# Altium footprint library Connectors.PcbLib: 79 footprints (part 5 of 5)
Each footprint in its own frame and in the unit in brackets; x right, y up, seen from the top. Pads: shape width x height; smd on the part's side, far side on the other; paste and mask are expansions set on the pad; w line width, h text height; cw(c..) or ccw(c..) is an arc to the next point about the centre after c.
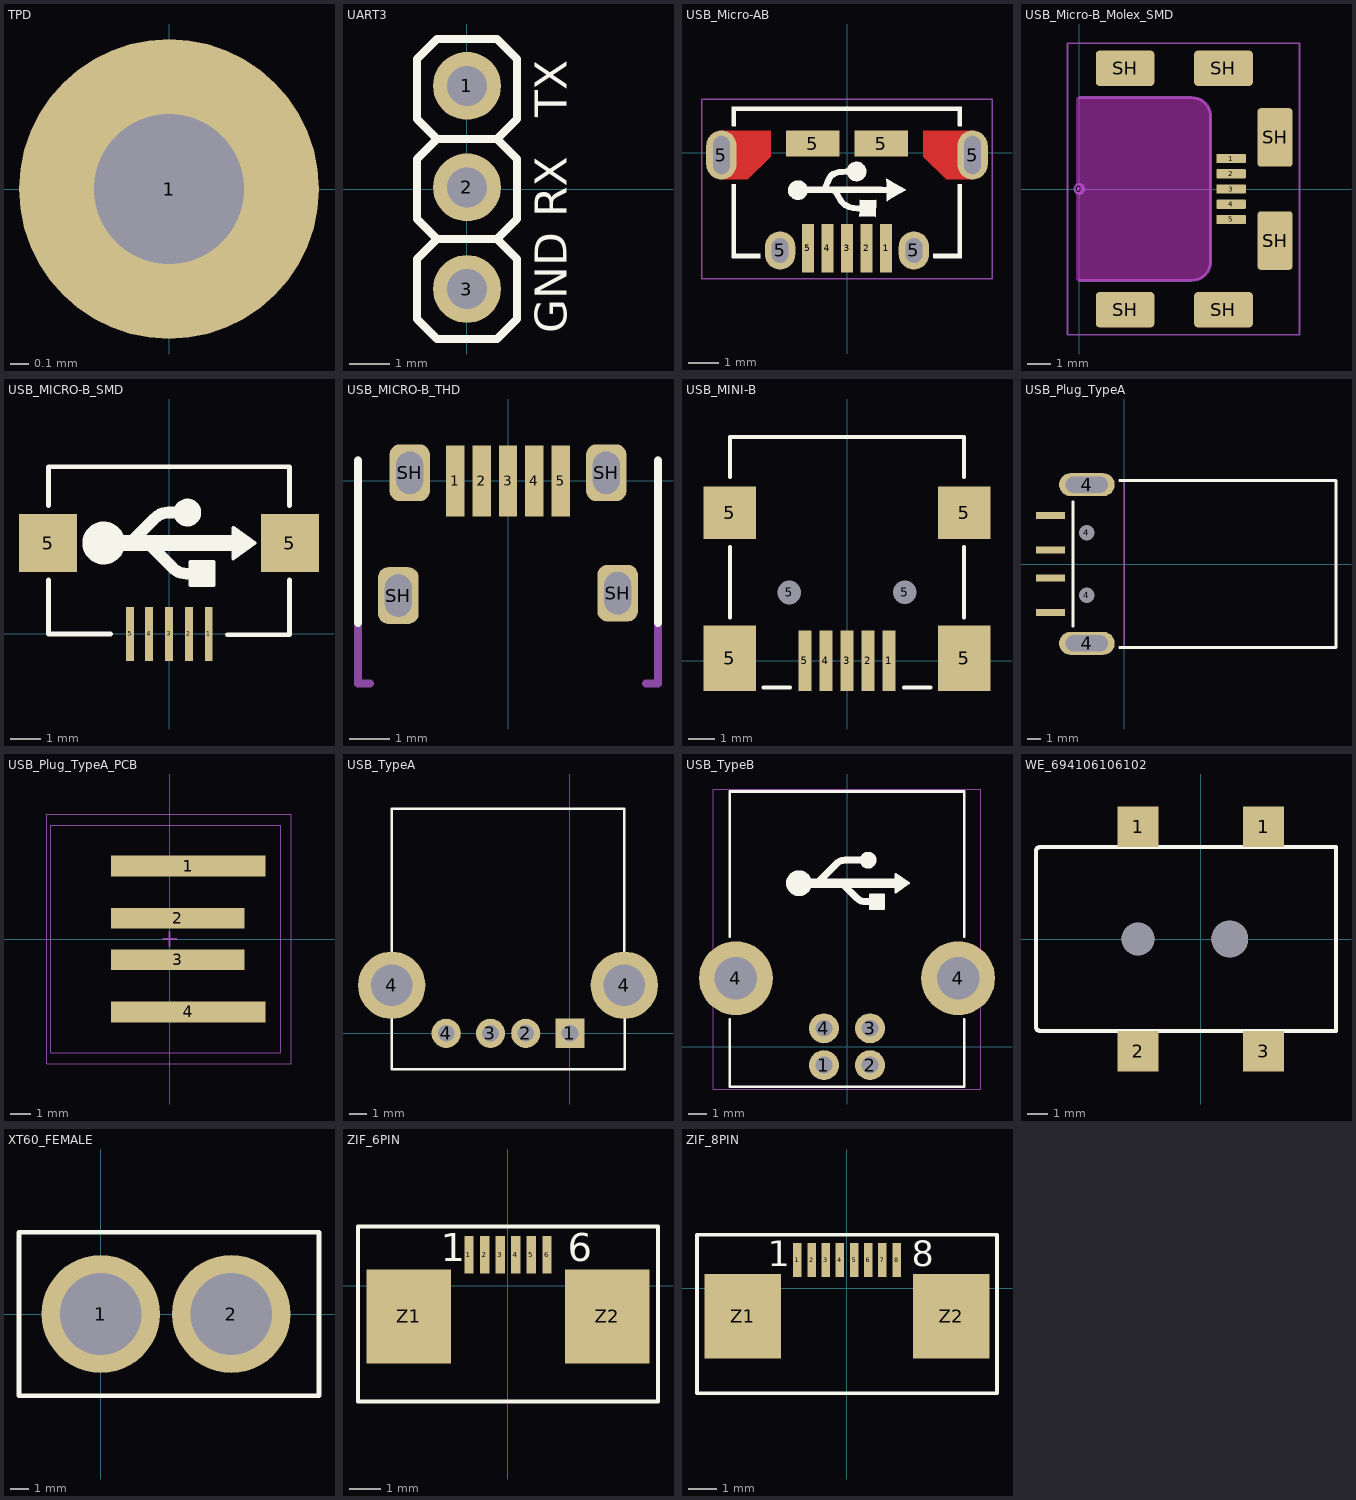
[diagram p4: the footprints below, top view; thin cyan lines are the x and y axes]

## TPD [mm] "Test point"
pads (1):
  round 1.6 hole 0.8: 1(0,0)

## UART3 [mm] "UART connector 3pin"
pads (3):
  round 1.7 hole 1 paste+0: 1(0,2.58) 2(0,0.04) 3(0,-2.5)
Top Overlay:
  lines w0.2: -0.75,-1.25 0.75,-1.25 ; -0.75,-1.25 -1.25,-1.75 -1.25,-3.25 -0.75,-3.75 0.75,-3.75 1.25,-3.25 1.25,-1.75 0.75,-1.25 ; -0.75,-1.25 -1.25,-0.75 -1.25,0.75 -0.75,1.25 ; -0.75,1.25 0.75,1.25 ; -0.75,1.25 -1.25,1.75 -1.25,3.25 -0.75,3.75 0.75,3.75 1.25,3.25 1.25,1.75 0.75,1.25 ; 0.75,-1.25 1.25,-0.75 1.25,0.75 0.75,1.25
  text "GND" at 2.5,-3.6 h0.8
  text "RX" at 2.5,-0.7 h0.8
  text "TX" at 2.5,1.8 h0.8
3D body "User Library-PLS-1.STEP": height 8.44, standoff -3, extent -1.27,-3.77 1.27,-1.23
3D body "User Library-PLS-1.STEP": height 8.44, standoff -3, extent -1.27,-1.23 1.27,1.31
3D body "User Library-PLS-1.STEP": height 8.44, standoff -3, extent -1.27,1.31 1.27,3.85

## USB_Micro-AB [mil]
height 153.54
pads (11):
  rect 15.75x64 smd: 1(51.18,-125) 2(25.59,-125) 3(0,-125) 4(-25.59,-125) 5(-51.18,-125)
  oval 40x64 hole 22 slot 50 at 90 deg mask+0: 5(-164.37,-3) 5(164.37,-3)
  oval 40x50 hole 22 slot 32 at 90 deg mask+0: 5(-87.6,-128) 5(87.6,-128)
  rect 70x34 smd mask+0: 5(-45,12) 5(45,12)
Top Layer:
  region: 100,29 164.37,29 164.37,-35 130,-35 100,-5
  region: -164.37,29 -100,29 -100,-5 -130,-35 -164.37,-35
Top Overlay:
  drawing of 24 lines, arcs and shapes, not listed
Top Solder:
  region: 100,29 164.37,29 164.37,-35 130,-35 100,-5
  region: -164.37,29 -100,29 -100,-5 -130,-35 -164.37,-35
Mechanical 14:
  lines w2: -190,-165 190,-165 190,70 -190,70 -190,-165
3D body "Micro USB.STP": height 106.7, standoff -9.04, extent -157.09,-141.34 157.08,72.44

## USB_Micro-B_Molex_SMD [mm]
height 1.2
pads (12):
  round 0.508 on Mech15: 0(0,0)
  rrect20% 1.25x0.4 smd: 1(6.475,1.3) 2(6.475,0.65) 3(6.475,0) 4(6.475,-0.65) 5(6.475,-1.3)
  rrect20% 2.5x1.5 smd: SH(1.95,-5.15) SH(1.95,5.15) SH(6.15,-5.15) SH(6.15,5.15)
  rrect20% 1.5x2.5 smd: SH(8.35,-2.2) SH(8.35,2.2)
Top Solder:
  rectangle: 5.842,-1.27 7.112,1.27
Keep-Out Layer:
  board cut-out: -0.127,3.9 4.8,3.9 4.879,3.9 5.033,3.869 5.179,3.809 5.31,3.721 5.421,3.61 5.509,3.479 5.569,3.333 5.6,3.179 5.6,3.1 5.6,-3.1 5.6,-3.179 5.569,-3.333 5.509,-3.479 5.421,-3.61 5.31,-3.721 5.179,-3.809 5.033,-3.869 4.879,-3.9 4.8,-3.9 -0.127,-3.9
Mechanical 13:
  lines w0.127: 0,-3.9 4.8,-3.9 ccw(c4.8,-3.1) 5.6,-3.1 5.6,3.1 ccw(c4.8,3.1) 4.8,3.9 0,3.9
Mechanical 15:
  lines w0.076: -0.5,-6.223 9.398,-6.223 9.398,6.223 -0.5,6.223 -0.5,-6.223
3D body "Micro USB B Receptacle Middle Mount.STEP": height 1.43, standoff -1.52, extent -0.43,-5.5 8.7,5.5

## USB_MICRO-B_SMD [mil]
height 153.54
pads (7):
  rect 10x70 smd: 1(51.18,0) 2(25.59,0) 3(0,0) 4(-25.59,0) 5(-50,0)
  rect 74.8x74.8 smd: 5(-155.51,116.84) 5(155.51,116.84)
Top Overlay:
  circle w35: c-84.07,117 r10
  circle w20: c23.56,156.21 r7.87
  region: 110.18,117 82.62,97.31 82.62,136.69
  region: 57.03,62.87 27.5,62.87 27.5,92.39 57.03,92.39
  lines w5: 27.5,62.87 27.5,92.39 57.03,92.39 57.03,62.87 27.5,62.87 ; 82.62,97.31 110.18,117 82.62,136.69 82.62,97.31
  lines w6: -155,69.8 -155,0 -75,0 ; -155,164.84 -155,215 155,215 155,164.84 ; 75,-1 155,-1 155,69.8
  lines w15: -52.85,114.46 -18.48,148.83 cw(c-0.65,131) -0.65,156.21 22.5,156.21 ; -24.7,114.54 4.83,85.01 ccw(c22.66,102.84) 22.66,77.63 42.5,77.63
  lines w20: -82.5,117 92.5,117
3D body "Micro USB.STP": height 106.7, standoff -9.04, extent -156.58,4.51 157.59,218.29

## USB_MICRO-B_THD [mm] "FCI 10103594-0001LF"
height 3
pads (9):
  rect 0.45x1.75 smd: 1(-1.3,0) 2(-0.65,0) 3(0,0) 4(0.65,0) 5(1.3,0)
  rrect50% 1x1.4 hole 0.66 slot 1.05 at 90 deg: SH(-2.705,-2.83) SH(-2.425,0.2) SH(2.425,0.2) SH(2.705,-2.77)
Top Overlay:
  lines w0.2: -3.7,-3.5 -3.7,0.5 ; 3.7,-3.5 3.7,0.5
Mechanical 13:
  lines w0.2: -3.7,0.5 -3.7,-5 -3.4,-5 ; 3.4,-5 3.7,-5 3.7,0.5
Mechanical 15:
  text ".Designator" at -3.55,-4.65 h0.7
3D body "USB-MINI-FCI-10103594-0001LF.STEP": height 2.89, standoff -0.71, extent -4.02,-5.6 4.02,0.433

## USB_MINI-B [mm]
height 3.9
pads (11):
  rect 0.5x2.3 smd mask+0.025: 1(1.6,0) 2(0.8,0) 3(0,0) 4(-0.8,0) 5(-1.6,0)
  rect 2x2.5 smd mask+0: 5(-4.45,0.1) 5(4.45,0.1)
  rect 2x2 smd mask+0: 5(-4.45,5.631) 5(4.45,5.631)
  round 0.6 hole 0.9 unplated: 5(-2.2,2.6) 5(2.2,2.6)
Top Overlay:
  lines w0.152: -4.445,1.651 -4.445,4.318 ; -4.445,6.985 -4.445,8.509 4.445,8.509 4.445,6.985 ; -3.175,-1.016 -2.159,-1.016 ; 2.159,-1.016 3.175,-1.016 ; 4.445,1.651 4.445,4.318
3D body "User Library-USB_mini_B.STEP": height 3.95, standoff -1, extent -5.35,-0.7 5.35,8.5

## USB_Plug_TypeA [mm]
height 4.5
pads (8):
  rect 2.1x0.5 smd: 1(-5.3,3.5) 2(-5.3,1) 3(-5.3,-1) 4(-5.3,-3.5)
  oval 4x1.65 hole 1.143 slot 3.048 at 0 deg: 4(-2.7,-5.7) 4(-2.7,5.7)
  round 0.8 hole 1.1 unplated: 4(-2.7,-2.25) 4(-2.7,2.25)
Top Overlay:
  lines w0.2: -3.7,-4.475 -3.7,4.475 ; -0.33,-6 15.2,-6 15.2,6 -0.33,6
Mechanical 13:
  lines w0.1: 0,-6 0,6

## USB_Plug_TypeA_PCB [mm]
height 3.9
pads (4):
  rect 7.41x1 smd: 1(0.897,3.5) 4(0.897,-3.5)
  rect 6.41x1 smd: 2(0.397,1) 3(0.397,-1)
Mechanical 13:
  lines w0.051: -5.908,-6 5.842,-6 5.842,6 -5.908,6 -5.908,-6 ; -5.715,-5.461 -5.715,5.461 5.334,5.461 5.334,-5.461 -5.715,-5.461
  lines w0.1: -0.33,0 0.33,0 ; 0,-0.33 0,0.33

## USB_TypeA [mil]
pads (6):
  rect 65x65 hole 37: 1(0,0)
  round 65 hole 37: 2(-98.5,0) 3(-177,0) 4(-275.6,0)
  round 150 hole 93: 4(-397,107) 4(121,107)
Top Overlay:
  lines w6: 121,107 121,500 -397,500 -397,107 -397,-80 122,-80 122,107
3D body "User Library-USB-A-01.step": height 274.23, standoff -164.75, extent -449.02,-45 173.03,494.37

## USB_TypeB [mm]
height 11.1
pads (6):
  round 1.626 hole 0.914 mask+0.025: 1(-1.25,-0.995) 2(1.25,-0.995) 3(1.25,1.005) 4(-1.25,1.005)
  round 4 hole 2.3 mask+0: 4(-6.02,3.715) 4(6.02,3.715)
Top Overlay:
  circle w0.508: c1.145,10.115 r0.2
  circle w0.889: c-2.605,8.865 r0.254
  region: 1.995,7.49 1.245,7.49 1.245,8.24 1.995,8.24
  region: 3.345,8.865 2.645,8.365 2.645,9.365
  lines w0.127: 1.245,7.49 1.995,7.49 1.995,8.24 1.245,8.24 1.245,7.49 ; 2.645,8.365 2.645,9.365 3.345,8.865 2.645,8.365
  lines w0.152: -6.35,1.495 -6.35,-2.159 6.35,-2.159 6.35,1.495 ; -6.35,5.969 -6.35,13.843 6.35,13.843 6.35,5.969
  lines w0.381: -1.558,8.927 -0.558,9.927 cw(c-0.105,9.474) -0.105,10.115 1.145,10.115 ; -0.208,8.802 0.542,8.052 ccw(c0.995,8.505) 0.995,7.865 1.245,7.865
  lines w0.508: -2.105,8.865 2.645,8.865
Mechanical 14:
  lines w0.051: -7.239,-2.286 -7.239,13.97 7.239,13.97 7.239,-2.286 -7.239,-2.286
3D body "c-0292304-01-b-3d.stp": height 11.5, standoff -3.93, extent -7.194,-1.705 7.194,13.995

## WE_694106106102 [mm] "WR-DC_DC Power Jack_Right Angled_SMT Center Pin ?2.0_Plug ID ?2.05_Plug OD ?5.5_with 4 Soldering Pag & Peg"
height 11
pads (6):
  rect 2x2 smd: 1(-3.075,5.5) 1(3.075,5.5) 2(-3.075,-5.5) 3(3.075,-5.5)
  round 1.6 hole 1.6 unplated: ""(-3.075,0)
  round 1.8 hole 1.8 unplated: ""(1.425,0)
Top Overlay:
  lines w0.2: -8.075,-4.31 -8.075,4.31 ; -8.075,-4.3 ccw(c-7.887,-4.312) -7.875,-4.5 ; -8.075,4.3 cw(c-7.887,4.312) -7.875,4.5 ; -7.885,-4.5 6.625,-4.5 6.625,4.5 -7.885,4.5
3D body "694106106102.stp": height 11, standoff -1.2, extent -8.075,-6.248 6.625,6.252

## XT60_FEMALE [mm]
pads (2):
  round 6.5 hole 4.5: 1(0,0) 2(7.175,0)
Top Overlay:
  lines w0.254: -4.5,-4.5 12,-4.5 12,4.5 -4.5,4.5 -4.5,3.5 -4.5,-4.5
3D body "XT60 female.step": height 17.3, standoff -4.9, extent -4.225,-4.075 11.675,4.075

## ZIF_6PIN [mm] "06 pins"
height 2.1
pads (8):
  rect 0.3x1.2 smd: 1(-1.25,0.99) 2(-0.75,0.99) 3(-0.25,0.99) 4(0.25,0.99) 5(0.75,0.99) 6(1.25,0.99)
  rect 2.7x3 smd: Z1(-3.18,-0.99) Z2(3.18,-0.99)
Top Overlay:
  lines w0.127: -4.8,-3.71 4.8,-3.71 4.8,1.89 -4.8,1.89 -4.8,-3.71
  text "1" at -2.159,0.771 h0.9
  text "6" at 1.905,0.771 h0.9
3D body "68710614522.stp": height 2.06, standoff -0.04, extent -4.7,-3.71 4.7,1.39

## ZIF_8PIN [mm] "08 pins"
height 2.1
pads (10):
  rect 0.3x1.2 smd: 1(-1.75,0.99) 2(-1.25,0.99) 3(-0.75,0.99) 4(-0.25,0.99) 5(0.25,0.99) 6(0.75,0.99) 7(1.25,0.99) 8(1.75,0.99)
  rect 2.7x3 smd: Z1(-3.68,-0.99) Z2(3.68,-0.99)
Top Overlay:
  lines w0.127: -5.3,-3.71 -5.3,1.89 5.3,1.89 5.3,-3.71 -5.3,-3.71
  text "1" at -2.794,0.771 h0.9
  text "8" at 2.286,0.771 h0.9
3D body "68710814522.stp": height 2.06, standoff -0.04, extent -5.2,-3.71 5.2,1.39